# Altium footprint library PcbLibUltimate (1).pcblib: 202 footprints (part 12 of 13)
Each footprint in its own frame and in the unit in brackets; x right, y up, seen from the top. Pads: shape width x height; smd on the part's side, far side on the other; paste and mask are expansions set on the pad; w line width, h text height; cw(c..) or ccw(c..) is an arc to the next point about the centre after c.
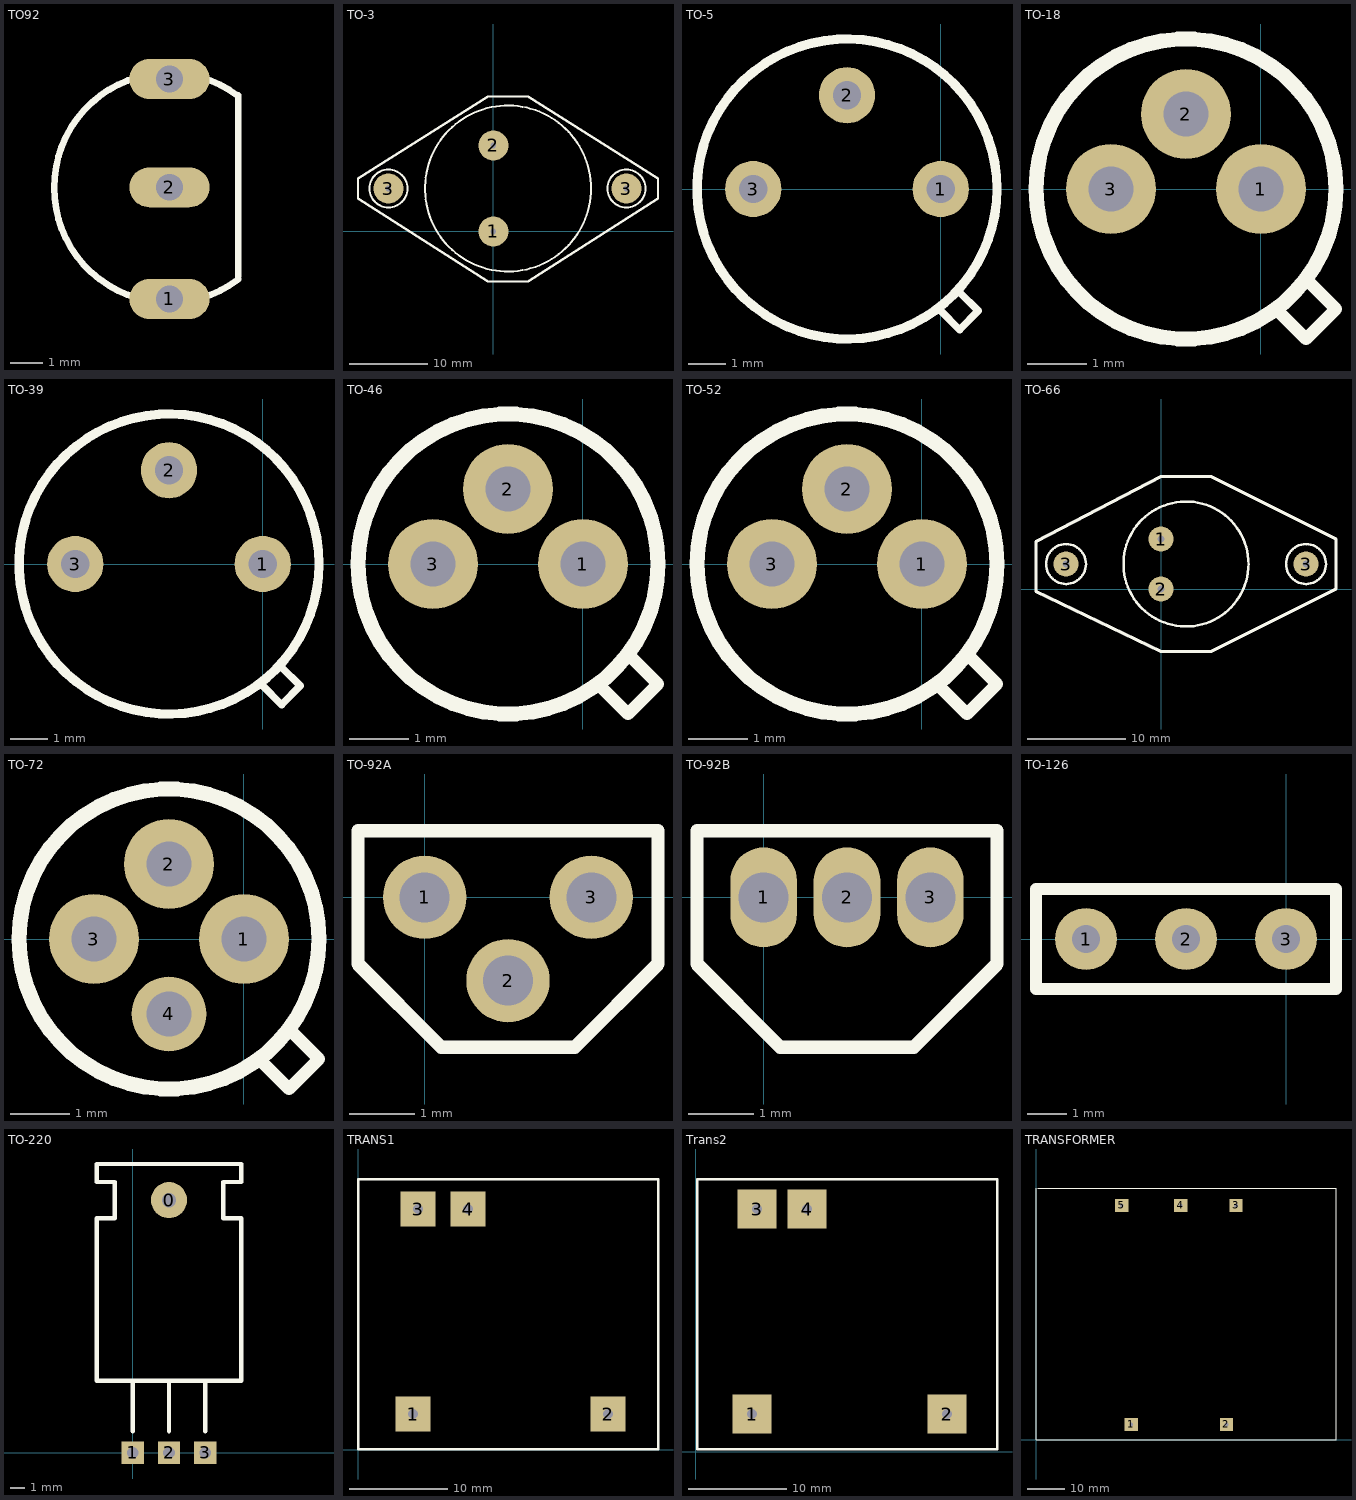
[diagram p11: the footprints below, top view; thin cyan lines are the x and y axes]

## TO92 [mil]
pads (3):
  oval 95.98x47.99 hole 32.01: 1(393.7,456.69) 2(393.7,590.55) 3(393.7,720.47)
Top Overlay:
  lines w7.87: 476.38,480.32 cw(c393.17,590.15) 476.38,699.99 ; 476.38,484.25 476.38,700.79
3D body "SW3dPS-TO92.STEP": height 381.89, standoff -62.94, extent 294.17,481.68 454.73,699.42

## TO-3 [mil]
pads (4):
  round 150 hole 28: 1(0,0) 2(0,430) 3(-525,215) 3(665,215)
Top Overlay:
  circle w10: c73,215 r415
  circle w10: c665,215 r95
  circle w10: c-525,215 r95
  lines w12: -677,165 -27,-250 173,-250 823,165 823,265 173,675 -27,675 -677,265 -677,165

## TO-5 [mil]
pads (3):
  round 60 hole 30: 1(0,0) 2(-100,100) 3(-200,0)
Top Overlay:
  circle w10: c-100,0 r160
  lines w8: 0,-130 20,-150 40,-130 20,-110

## TO-18 [mil]
pads (3):
  round 60 hole 30: 1(0,0) 2(-50,50) 3(-100,0)
Top Overlay:
  circle w10: c-50,0 r100
  lines w8: 10,-80 30,-100 50,-80 30,-60

## TO-39 [mil]
pads (3):
  round 60 hole 30: 1(0,0) 2(-100,100) 3(-200,0)
Top Overlay:
  circle w10: c-100,0 r160
  lines w8: 0,-130 20,-150 40,-130 20,-110

## TO-46 [mil]
pads (3):
  round 60 hole 30: 1(0,0) 2(-50,50) 3(-100,0)
Top Overlay:
  circle w10: c-50,0 r100
  lines w8: 10,-80 30,-100 50,-80 30,-60

## TO-52 [mil]
pads (3):
  round 60 hole 30: 1(0,0) 2(-50,50) 3(-100,0)
Top Overlay:
  circle w10: c-50,0 r100
  lines w8: 10,-80 30,-100 50,-80 30,-60

## TO-66 [mil]
pads (4):
  round 100 hole 28: 1(0,200) 2(0,0) 3(-380,100) 3(580,100)
Top Overlay:
  circle w10: c580,100 r80
  circle w10: c-380,100 r80
  circle w10: c100,100 r250
  lines w12: -500,-10 0,-250 200,-250 700,0 700,200 200,450 0,450 -500,190 -500,-10

## TO-72 [mil]
pads (4):
  round 60 hole 30: 1(0,0) 2(-50,50) 3(-100,0)
  round 50 hole 30: 4(-50,-50)
Top Overlay:
  circle w10: c-50,0 r100
  lines w8: 10,-80 30,-100 50,-80 30,-60

## TO-92A [mil]
pads (3):
  round 50 hole 30: 1(0,0) 2(50,-50) 3(100,0)
Top Overlay:
  lines w8: -40,-40 -40,40 140,40 140,-40 90,-90 10,-90 -40,-40

## TO-92B [mil]
pads (3):
  oval 40x60 hole 30: 1(0,0) 2(50,0) 3(100,0)
Top Overlay:
  lines w8: -40,-40 10,-90 90,-90 140,-40 140,40 -40,40 -40,-40

## TO-126 [mil]
pads (3):
  round 62 hole 28: 1(-200,0) 2(-100,0) 3(0,0)
Top Overlay:
  lines w12: -250,-50 -250,50 50,50 50,-50 -250,-50

## TO-220 [mil]
pads (4):
  round 100 hole 40: 0(100,700)
  rect 62x62 hole 32: 1(0,0) 2(100,0) 3(200,0)
Top Overlay:
  lines w12: 0,60 0,200 ; 100,60 100,200 ; 200,60 200,200 ; -100,200 -100,650 -50,650 -50,750 -100,750 -100,800 300,800 300,750 250,750 250,650 300,650 300,200 -100,200

## TRANS1 [mm] "TRANSFORMER1"
pads (4):
  rect 3.524x3.524 hole 1: 1(5.548,3.608) 2(25.36,3.608) 3(6.056,24.436) 4(11.136,24.436)
Top Overlay:
  lines w0.254: -0.04,0.052 30.44,0.052 30.44,27.484 -0.04,27.484 -0.04,0.052

## Trans2 [mm]
pads (4):
  rect 4x4 hole 1: 1(5.715,3.81) 2(25.527,3.81) 3(6.223,24.638) 4(11.303,24.638)
Top Overlay:
  lines w0.254: 0.127,0.254 30.607,0.254 30.607,27.686 0.127,27.686 0.127,0.254

## TRANSFORMER [mil]
pads (5):
  rect 138.74x138.74 hole 39.37: 1(1000,160) 2(2000,160) 3(2100,2460) 4(1520,2460) 5(900,2460)
Top Overlay:
  lines w10: 0,2640 0,0 3149.61,0 3149.61,2640 20,2640